# Altium footprint library TinyShuffle v.0.PcbLib: 54 footprints (part 2 of 4)
Each footprint in its own frame and in the unit in brackets; x right, y up, seen from the top. Pads: shape width x height; smd on the part's side, far side on the other; paste and mask are expansions set on the pad; w line width, h text height; cw(c..) or ccw(c..) is an arc to the next point about the centre after c.
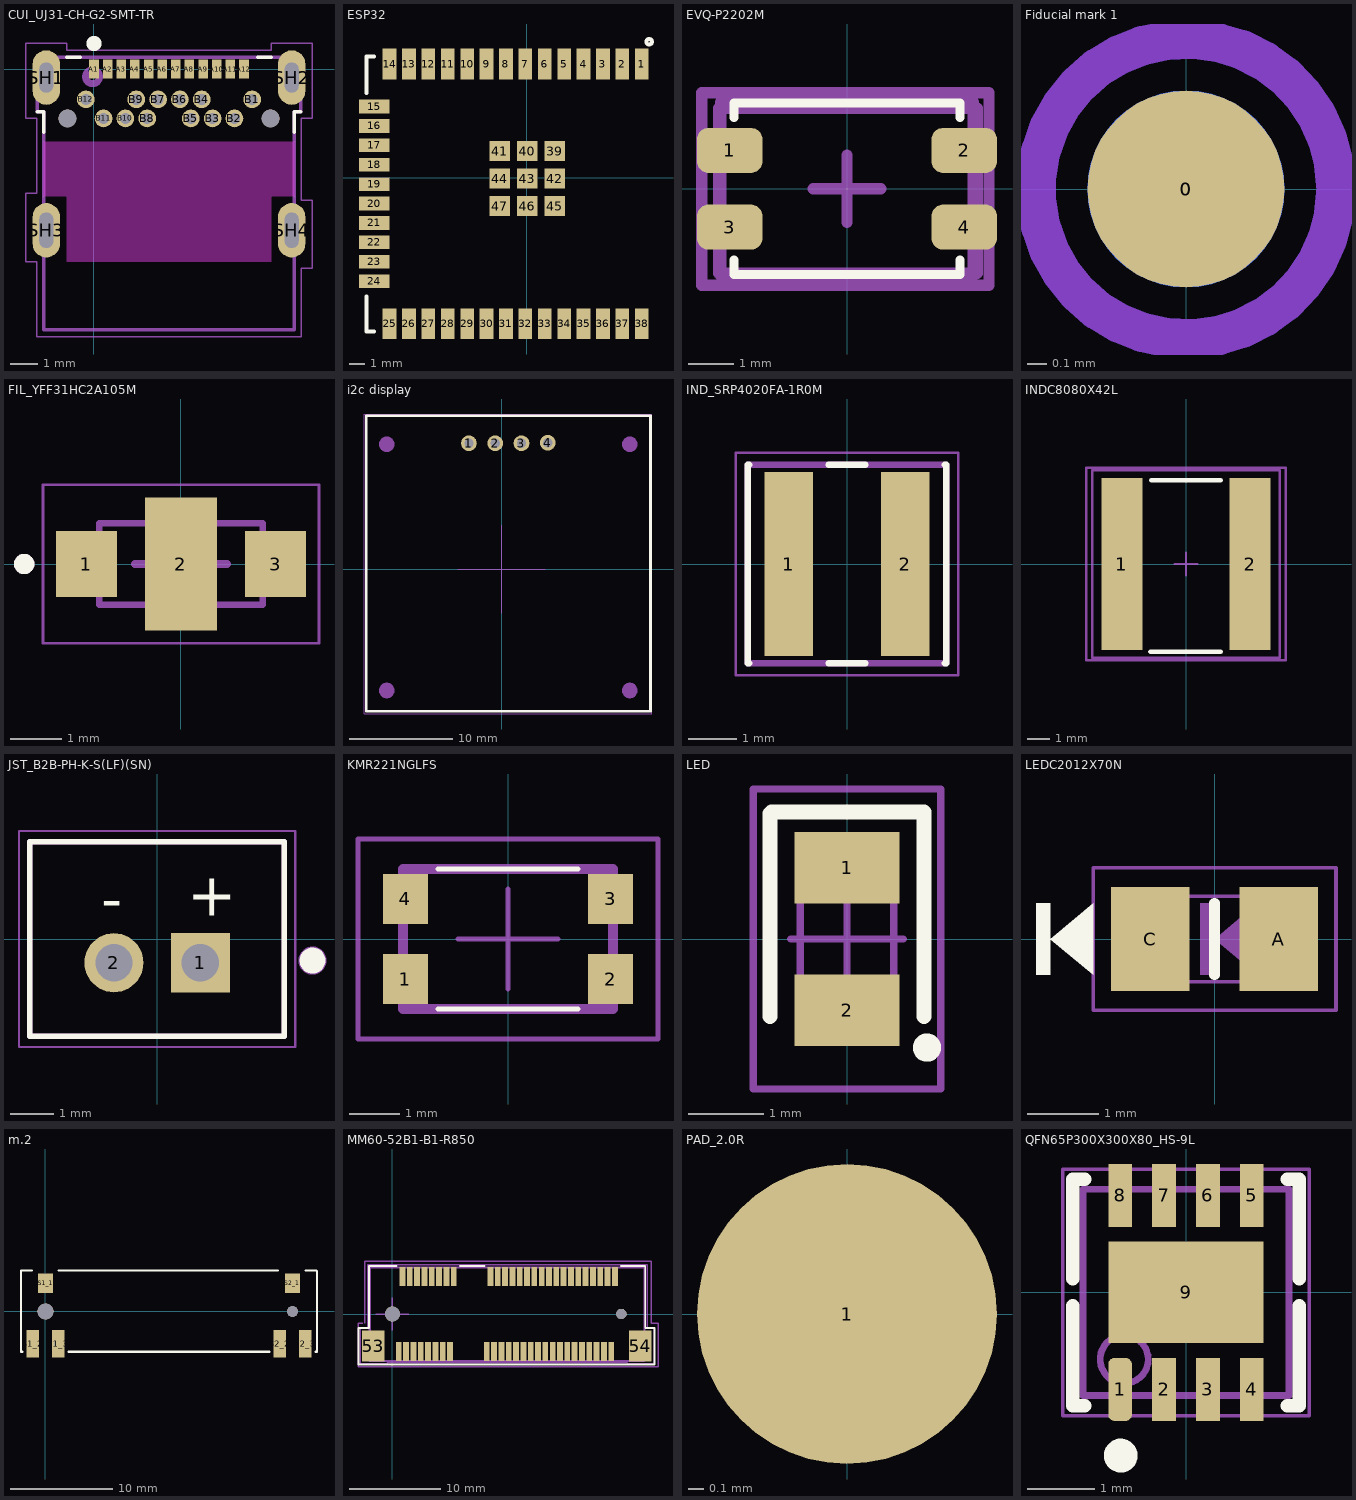
[diagram p1: the footprints below, top view; thin cyan lines are the x and y axes]

## CUI_UJ31-CH-G2-SMT-TR [mm]
pads (30):
  rect 0.35x0.7 smd: A1(0,0) A2(0.5,0) A3(1,0) A4(1.5,0) A5(2,0) A6(2.5,0) A7(3,0) A8(3.5,0) A9(4,0) A10(4.5,0) A11(5,0) A12(5.5,0)
  round 0.65 hole 0.4 mask+0.05: B1(5.8,-1.11) B12(-0.3,-1.11)
  round 0.65 hole 0.4 mask+0.15: B2(5.15,-1.81) B3(4.35,-1.81) B4(3.95,-1.11) B5(3.55,-1.81) B6(3.15,-1.11) B7(2.35,-1.11) B8(1.95,-1.81) B9(1.55,-1.11) B10(1.15,-1.81) B11(0.35,-1.81)
  oval 1x2 hole 0.5 slot 1.1 at 90 deg: SH1(-1.75,-0.31) SH2(7.25,-0.31)
  oval 1x2 hole 0.5 slot 1.3 at 90 deg: SH3(-1.75,-5.91) SH4(7.25,-5.91)
  round 0.65 hole 0.65 unplated: ""(-0.975,-1.81) ""(6.475,-1.81)
Top Overlay:
  circle w0.4: c0,0.94 r0.076
  lines w0.127: -2.075,-1.56 -1.85,-1.56 -1.85,-2.31 ; -1,0.44 -0.5,0.44 ; 6,0.44 6.5,0.44 ; 7.35,-2.31 7.35,-1.56 7.575,-1.56
Top Solder:
  region: -0.279,0.457 -0.279,-0.457 5.791,-0.457 5.791,0.457
Keep-Out Layer:
  region: 7.35,-4.66 6.5,-4.66 6.5,-7.06 -1,-7.06 -1,-4.66 -1.85,-4.66 -1.85,-2.667 7.35,-2.667
  region: 7.35,-4.66 6.5,-4.66 6.5,-7.06 -1,-7.06 -1,-4.66 -1.85,-4.66 -1.85,-2.667 7.35,-2.667
Top Assembly (Mech11):
  circle w0.254: c-0.051,-0.279 r0.259
  lines w0.127: -2.075,-1.56 -1.85,-1.56 -1.85,-9.56 7.35,-9.56 7.35,-1.56 7.575,-1.56 7.575,0.44 -2.075,0.44 -2.075,-1.56
  text "'.Designator'" at 1.162,-5.355 h1.5
Top Courtyard:
  lines w0.05: -2.5,-7.06 -2.1,-7.06 -2.1,-9.81 7.6,-9.81 7.6,-7.31 8,-7.31 8,-4.81 7.6,-4.81 7.6,-1.81 8,-1.81 8,0.94 6.5,0.94 6.5,0.69 -1,0.69 -1,0.94 -2.5,0.94 -2.5,-1.81 -2.1,-1.81 -2.1,-4.56 -2.5,-4.56 -2.5,-7.06
3D body "CUI_DEVICES_UJ31-CH-G2-SMT-TR.step": height 4.5, standoff -1.16, extent -2.087,-9.561 7.625,0.439

## ESP32 [mm]
pads (47):
  rect 0.9x2 smd: 1(7.513,7.433) 2(6.243,7.433) 3(4.973,7.433) 4(3.703,7.433) 5(2.433,7.433) 6(1.163,7.433) 7(-0.107,7.433) 8(-1.377,7.433) 9(-2.647,7.433) 10(-3.917,7.433) 11(-5.187,7.433) 12(-6.457,7.433) 13(-7.727,7.433) 14(-8.997,7.433) 25(-8.997,-9.567) 26(-7.727,-9.567) 27(-6.457,-9.567) 28(-5.187,-9.567) 29(-3.917,-9.567) 30(-2.647,-9.567) 31(-1.377,-9.567) 32(-0.107,-9.567) 33(1.163,-9.567) 34(2.433,-9.567) 35(3.703,-9.567) 36(4.973,-9.567) 37(6.243,-9.567) 38(7.513,-9.567)
  rect 2x0.9 smd: 15(-9.997,4.648) 16(-9.997,3.378) 17(-9.997,2.108) 18(-9.997,0.838) 19(-9.997,-0.432) 20(-9.997,-1.702) 21(-9.997,-2.972) 22(-9.997,-4.242) 23(-9.997,-5.512) 24(-9.997,-6.782)
  rect 1.33x1.33 smd: 39(1.813,1.733) 40(0.013,1.733) 41(-1.787,1.733) 42(1.813,-0.067) 43(0.013,-0.067) 44(-1.787,-0.067) 45(1.813,-1.867) 46(0.013,-1.867) 47(-1.787,-1.867)
Top Overlay:
  circle w0.254: c8.001,8.89 r0.18
  lines w0.254: -10.497,-7.767 -10.497,-10.067 -9.997,-10.067 ; -10.497,5.533 -10.497,7.933 -9.997,7.933
3D body "User Library-ESP321.step": height -0.41, standoff -3.32, extent -10.461,-10.121 15.039,7.879

## EVQ-P2202M [mm]
pads (4):
  rrect50% 1.45x1 smd paste+0 mask+0: 1(-2.6,0.85) 2(2.6,0.85) 3(-2.6,-0.85) 4(2.6,-0.85)
Top Overlay:
  lines w0.2: -2.5,-1.575 -2.5,-1.9 2.5,-1.9 2.5,-1.575 ; -2.5,1.575 -2.5,1.9 2.5,1.9 2.5,1.575
Top Assembly (Mech11):
  lines w0.254: -2.84,-1.87 2.89,-1.87 2.89,1.78 -2.84,1.78 -2.84,-1.87
  text "'.Designator'" at -0.897,-0.44 h1
Top Courtyard:
  lines w0.25: -0.75,0 0.75,0 ; 0,-0.75 0,0.75 ; -3.22,-2.14 -3.22,2.13 3.15,2.13 3.15,-2.14 -3.22,-2.14
Mechanical 21:
  lines w0.25: -2.8,-1.925 -2.8,1.925 2.8,1.925 2.8,-1.925 2.35,-1.925 -2.8,-1.925
  text "'.Designator'" at -0.5,-0.5 h0.8
3D body "EVQ-P2-0246-02M+P9-HP-02M v1.step": height 2.11, standoff 0.01, extent -2.729,-1.742 2.771,1.758

## Fiducial mark 1 [mm] "Fiducial mark for automatic assembly"
pads (2):
  round 1 smd far side paste-1 mask+0.45: 0(0,0)
  round 1 smd paste-1 mask+0.45: 0(0,0)
Top Layer keep-out:
  circle w0.2: c0,0 r0.762
Bottom Layer keep-out:
  circle w0.2: c0,0 r0.762

## FIL_YFF31HC2A105M [mm]
pads (3):
  rect 1.2x1.3 smd paste-0.03: 1(-1.85,0) 3(1.85,0)
  rect 1.4x2.6 smd paste-2 mask+0: 2(0,0)
Top Overlay:
  circle w0.2: c-3.069,0 r0.1
Top Paste:
  region: 0.686,-1.276 -0.686,-1.276 -0.686,-0.406 0.686,-0.406
  region: 0.686,0.4 -0.686,0.4 -0.686,1.27 0.686,1.27
Top Solder:
  region: 0.8,-1.4 -0.8,-1.4 -0.8,-0.4 0.8,-0.4
  region: 0.8,0.4 -0.8,0.4 -0.8,1.4 0.8,1.4
Top Assembly (Mech11):
  circle w0.2: c-3.069,0 r0.1
  lines w0.127: -1.6,-0.8 1.6,-0.8 1.6,0.8 -1.6,0.8 -1.6,-0.8
  text "'.Designator'" at -1.227,1.147 h1.1
Top Courtyard:
  lines w0.05: -2.7,-1.55 2.7,-1.55 2.7,1.55 -2.7,1.55 -2.7,-1.55
  lines w0.152: -0.9,0 0,0 ; 0,-0.9 0,0 ; 0,0.9 0,0 ; 0.9,0 0,0
3D body "Part1.STEP": height 1.3, standoff 0, extent -1.6,-0.8 1.6,0.8

## i2c display [mil]
pads (8):
  round 60 hole 35: 1(-124.21,479.01) 2(-24.21,479.01) 3(75.79,479.01) 4(175.79,481.14)
  round 60 on Mech13: ""(-436.81,-461.93) ""(-436.81,475.07) ""(488.39,-461.93) ""(488.39,475.07)
Top Overlay:
  lines w10: -515.55,-540.67 -515.55,583.34 567.13,583.34 567.13,-540.67 -515.55,-540.67
Top Courtyard:
  lines w3.94: -167.32,0 0,0 ; 0,-167.32 0,0 ; 0,167.32 0,0 ; 167.32,0 0,0 ; -521.65,-551.18 -521.65,590.55 570.87,590.55 570.87,-551.18 0,-551.18 -521.65,-551.18
3D body "I2COLEDDisplayAdafruit.step": height 249.72, standoff -98.23, extent -499.82,-523.35 551.37,573.5

## IND_SRP4020FA-1R0M [mm]
height 2.1
pads (2):
  rect 1x3.8 smd: 1(-1.2,0) 2(1.2,0)
Top Overlay:
  lines w0.127: -2.02,-2.05 -2.05,-2.05 -2.05,2.05 -2.02,2.05 ; -0.38,-2.05 0.38,-2.05 ; -0.38,2.05 0.38,2.05 ; 2.02,-2.05 2.05,-2.05 2.05,2.05 2.02,2.05
Top Assembly (Mech11):
  lines w0.127: -2.05,-2.05 -2.05,2.05 2.05,2.05 2.05,-2.05 -2.05,-2.05
  text "'.Designator'" at -0.745,-0.351 h1.1
Top Courtyard:
  lines w0.05: -2.3,-2.3 2.3,-2.3 2.3,2.3 -2.3,2.3 -2.3,-2.3
3D body "SRP4020FA.stp": height 1.96, standoff 0.05, extent -2.025,-2.068 2.075,2.032

## INDC8080X42L [mm] "Chip Inductor, 2-Leads, Body 8,00x8,00mm, IPC High Density"
height 4.2
pads (2):
  rect 1.8x7.5 smd: 1(-2.8,0) 2(2.8,0)
Top Overlay:
  lines w0.2: -1.549,-3.835 1.524,-3.835 ; -1.524,3.658 1.524,3.658
Top Assembly:
  lines w0.1: -4.1,-4.1 4.1,-4.1 4.1,4.1 -4.1,4.1 -4.1,-4.1
Top Courtyard:
  lines w0.1: -0.5,0 0.5,0 ; 0,-0.5 0,0.5 ; -4.35,-4.2 4.35,-4.2 4.35,4.2 -4.35,4.2 -4.35,-4.2
3D body "INDC8080X42L.step": height 4.2, standoff 0, extent -4.1,-4.1 4.1,4.1

## JST_B2B-PH-K-S(LF)(SN) [mm]
pads (2):
  rect 1.368x1.368 hole 0.86: 1(1,-0.55)
  round 1.368 hole 0.86: 2(-1,-0.55)
Top Overlay:
  circle w0.3: c3.6,-0.5 r0.15
  lines w0.127: -2.95,-2.25 -2.95,2.25 2.95,2.25 2.95,-2.25 -2.95,-2.25
  text "-" at -1.3,0.45 h1
  text "+" at 0.7,0.533 h1
Top Assembly (Mech11):
  circle w0.35: c3.6,-0.5 r0.15
  lines w0.127: -2.95,-2.25 2.95,-2.25 2.95,2.25 -2.95,2.25 -2.95,-2.25
  text "'.Designator'" at -1.266,0.686 h1.1
Top Courtyard:
  lines w0.05: -3.2,-2.5 3.2,-2.5 3.2,2.5 -3.2,2.5 -3.2,-2.5
3D body "B2B-PH-K-S(LF)(SN)--3DModel-STEP-56544.STEP": height 6.01, standoff -3.39, extent -2.95,-2.25 2.95,2.25

## KMR221NGLFS [mm]
pads (4):
  rect 0.9x1 smd: 1(-2.05,-0.8) 2(2.05,-0.8) 3(2.05,0.8) 4(-2.05,0.8)
Top Overlay:
  lines w0.1: -1.4,-1.4 1.4,-1.4 ; -1.4,1.4 1.4,1.4
Top Assembly (Mech11):
  lines w0.2: -2.1,-1.4 2.1,-1.4 2.1,1.4 -2.1,1.4 -2.1,-1.4
  text "'.Designator'" at -1.075,-0.58 h1.1
Top Courtyard:
  lines w0.1: -1,0 0,0 ; 0,-1 0,0 ; 0,1 0,0 ; 1,0 0,0 ; -3,-2 3,-2 3,2 -3,2 -3,-2
3D body "User Library-Switch-CK-KMR2.STEP": height 2.1, standoff 0, extent -2.35,-1.478 2.25,1.522

## LED [mm]
pads (2):
  rect 1.4x0.95 smd: 1(0,0.95) 2(0,-0.95)
Top Overlay:
  circle w0.254: c1.067,-1.448 r0.062
  lines w0.2: -1.025,-1.034 -1.025,1.675 -1.009,1.691 1.025,1.691 1.025,-1.034
Top Assembly (Mech11):
  lines w0.1: -0.625,-1 -0.625,1 0.625,1 0.625,-1 -0.625,-1
Top Courtyard:
  lines w0.1: -0.75,0 0,0 ; 0,-0.75 0,0 ; 0,0.75 0,0 ; 0.75,0 0,0 ; -1.25,-2 1.25,-2 1.25,2 -1.25,2 -1.25,-2
3D body "User Library-KP-2012.STEP": height 1.1, standoff 0, extent -0.625,-1.001 0.625,1.001

## LEDC2012X70N [mm]
pads (2):
  rect 1.1x1.45 smd paste-0.05: A(0.9,0) C(-0.9,0)
Top Overlay:
  region: -2.5,0 -2.5,0.5 -2.3,0.5 -2.3,0
  region: -2.3,0 -1.7,0.5 -1.7,0
  region: -2.5,0 -2.5,-0.5 -2.3,-0.5 -2.3,0
  region: -2.3,0 -1.7,-0.5 -1.7,0
  lines w0.152: 0,-0.5 0,0.5
Top 3D Body:
  region: -0.2,0 -0.2,0.5 0,0.5 0,0
  region: 0,0 0.6,0.5 0.6,0
  region: -0.2,0 -0.2,-0.5 0,-0.5 0,0
  region: 0,0 0.6,-0.5 0.6,0
  region: -0.5,-0.6 -1,-0.6 -1,0.6 -0.5,0.6
  lines w0.05: -1,-0.6 1,-0.6 1,0.6 -1,0.6 -1,-0.6
Top Courtyard:
  lines w0.05: -1.7,-1 1.7,-1 1.7,1 -1.7,1 -1.7,-1
3D body "LED_598-8110-107F_DIA.step": height 0.71, standoff 0, extent -1.003,-0.622 1.003,0.622

## m.2 [mm]
pads (8):
  rect 1.5x1.9 smd: S1_1(0.009,2.751) S2_1(24.209,2.751)
  rect 1.2x2.7 smd: S1_2(-1.241,-3.149) S1_3(1.259,-3.149) S2_2(22.959,-3.149) S2_3(25.459,-3.149)
  round 1.55 hole 1.55 unplated mask+0.102: ""(0.009,0.001)
  round 1.05 hole 1.05 unplated: ""(24.209,0.001)
Top Overlay:
  lines w0.2: -2.391,4 -2.391,-3.949 -2.241,-3.949 ; 2.259,-3.949 21.959,-3.949 ; 26.459,-3.949 26.609,-3.949 26.609,3.951
  lines w0.203: -2.391,4 -1.3,4 ; 1.3,4 22.8,4 ; 25.5,4 26.559,4
Mechanical 6:
  lines w0.127: 26.609,-3.949 26.609,3.951 26.609,-3.949
3D body "K3D-MM60-EZH039-B5-R2 JAE Connector Division Proprietary.STEP": height 4.7, standoff -0.9, extent -2.391,-3.924 26.609,3.976

## MM60-52B1-B1-R850 [mil] "PCIE CARD CONNECTOR"
height 45.67
pads (56):
  rect 25x83 smd mask+0.79: 1(27.56,-161.41) 2(43.31,161.42) 3(59.05,-161.41) 4(74.8,161.42) 5(90.55,-161.41) 6(106.3,161.42) 7(122.05,-161.41) 8(137.79,161.42) 9(153.54,-161.41) 10(169.29,161.42) 11(185.04,-161.41) 12(200.79,161.42) 13(216.53,-161.41) 14(232.28,161.42) 15(248.03,-161.41) 16(263.78,161.42) 17(405.51,-161.41) 18(421.26,161.42) 19(437.01,-161.41) 20(452.76,161.42) 21(468.5,-161.41) 22(484.25,161.42) 23(500,-161.41) 24(515.75,161.42) 25(531.5,-161.41) 26(547.24,161.42) 27(562.99,-161.41) 28(578.74,161.42) 29(594.49,-161.41) 30(610.24,161.42) 31(625.98,-161.41) 32(641.73,161.42) 33(657.48,-161.41) 34(673.23,161.42) 35(688.98,-161.41) 36(704.72,161.42) 37(720.47,-161.41) 38(736.22,161.42) 39(751.97,-161.41) 40(767.72,161.42) 41(783.46,-161.41) 42(799.21,161.42) 43(814.96,-161.41) 44(830.71,161.42) 45(846.46,-161.41) 46(862.2,161.42) 47(877.95,-161.41) 48(893.7,161.42) 49(909.45,-161.41) 50(925.2,161.42) 51(940.94,-161.41) 52(956.69,161.42)
  rect 96x132 smd: 53(-81.69,-137.79) 54(1065.94,-137.79)
  round 64.02 hole 64 unplated: ""(0,0)
  round 44.02 hole 44 unplated: ""(984.25,0)
Top Overlay:
  lines w7.99: 17.53,205.79 -100,205.79 -100,-60 -146,-60 -146,-217 1127,-217 1127,-60 1087,-60 1087,205.79 982.48,205.79 ; 289.56,205.79 395.48,205.79
Top Solder:
  region: 984.25,32.28 975.9,31.18 968.11,27.95 961.43,22.83 956.3,16.14 953.08,8.36 951.98,0 953.08,-8.35 956.3,-16.14 961.43,-22.82 968.11,-27.95 975.9,-31.17 984.25,-32.27 992.61,-31.17 1000.39,-27.95 1007.07,-22.82 1012.2,-16.14 1015.43,-8.35 1016.53,0 1015.43,8.36 1012.2,16.14 1007.07,22.83 1000.39,27.95 992.61,31.18
  region: 0,42.36 -10.96,40.92 -21.18,36.69 -29.95,29.95 -36.69,21.18 -40.92,10.96 -42.36,0 -40.92,-10.96 -36.69,-21.18 -29.95,-29.96 -21.18,-36.69 -10.96,-40.92 0,-42.36 10.96,-40.92 21.18,-36.69 29.95,-29.96 36.69,-21.18 40.92,-10.96 42.36,0 40.92,10.96 36.69,21.18 29.95,29.95 21.18,36.69 10.96,40.92
Top 3D Body:
  lines w5: -98.37,-203.21 1082.63,-203.21 1082.63,198.79 -98.37,198.79 -98.37,-203.21
  lines w6: -139,-213.16 -21.09,-213.16 -21.09,-210.58 1010.54,-210.58 1010.54,-213.16 1126.54,-213.16 1126.54,-61.16 1095.22,-61.16 1095.22,211.42 -106,211.42 -106,-61.16 -139,-61.16 -139,-213.16 ; -95.78,-200.58 1085.22,-200.58 1085.22,201.42 -95.78,201.42 -95.78,-200.58
Top Courtyard:
  lines w5.91: -127.95,-39.37 -147.64,-39.37 -147.64,-226.38 1141.73,-226.38 1141.73,-39.37 1112.2,-39.37 1112.2,226.38 -118.11,226.38 -118.11,-39.37 ; -70.87,0 0,0 ; 0,-70.87 0,0 ; 0,70.87 0,0 ; 70.87,0 0,0
3D body "K3D-MM60-52B1-B1-R2 JAE Connector Division Proprietary.STEP": height 149.61, standoff -35.43, extent -92.92,-198.43 1076.37,195.27

## PAD_2.0R [mm] "Pad, SMD, R=2.0 mm"
height 0.05
pads (1):
  round 2 smd paste-1: 1(0,0)
3D body: height 0.05, standoff 0, extent -0.992,-0.998 1,0.998

## QFN65P300X300X80_HS-9L [mm] "QFN, 8-Leads, Body 3,00x3,00mm, Pitch 0,65mm, Thermal Pad 2,23x1,48mm, IPC High Density"
height 0.8
pads (9):
  rrect50% 0.35x0.93 smd mask+0.05: 1(-0.975,-1.435)
  rect 0.35x0.93 smd mask+0.05: 2(-0.325,-1.435) 3(0.325,-1.435) 4(0.975,-1.435) 5(0.975,1.435) 6(0.325,1.435) 7(-0.325,1.435) 8(-0.975,1.435)
  rect 2.3x1.5 smd mask+0.05: 9(0,0)
Top Overlay:
  circle w0.25: c-0.965,-2.413 r0.125
  lines w0.2: -1.675,-0.2 -1.675,-1.675 -1.5,-1.675 ; -1.675,0.2 -1.675,1.675 -1.5,1.675 ; 1.5,-1.675 1.675,-1.675 1.675,-0.2 ; 1.5,1.675 1.675,1.675 1.675,0.2
Top Assembly (Mech11):
  circle w0.1: c-0.914,-0.991 r0.356
  lines w0.1: -1.525,-1.525 1.525,-1.525 1.525,1.525 -1.525,1.525 -1.525,-1.525
  text ".Designator" at -0.914,0.127 h1
Top Courtyard:
  lines w0.05: -1.825,-1.825 1.825,-1.825 1.825,1.825 -1.825,1.825 -1.825,-1.825
  lines w0.1: -0.5,0 0.5,0 ; 0,-0.5 0,0.5
3D body: height 0.8, standoff 0.01, extent -1.525,-1.525 1.525,1.525